# Altium schematic symbol library AD_Lib.SchLib: 1239 symbols (part 7 of 9)
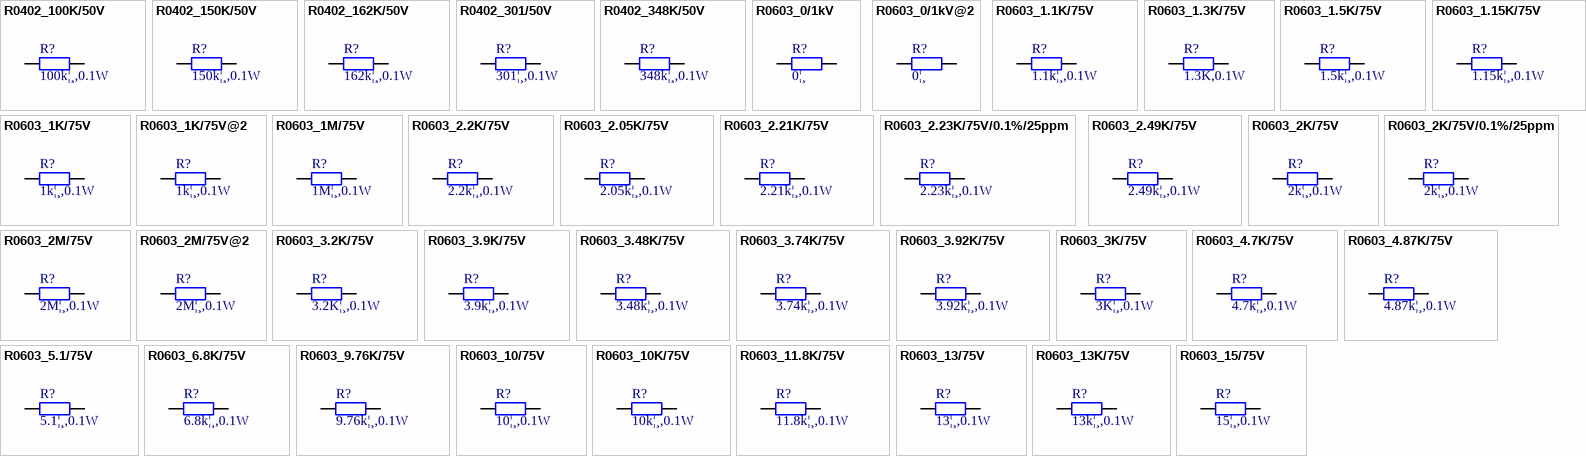
[diagram p48: symbols R0402_100K/50V to R0603_15/75V]

## R0603_3.74K/75V
designator R?, comment 3.74k¦¸,0.1W
ÌùÆ¬µç×è; Manufacturer: KOA; pro-environment: RoHS; Quality: -55~155¡æ; SN: 03.4.38.11.16037501S; other: 3.74k¦¸,0.1W,1%,75V; OPN: RK73H1JTTD3741F; PadsNum: 2; Category: µç×è; Part: RK73H1JTTD3741F; Value: 3.74k¦¸,0.1W; QTY: 5000; Price: 0.0234; OPN_JLC: OPN_JLC; SN_JLC: SN_JLC; Price_JLC: 0
footprint R0603 (ÌùÆ¬µç×è£¬¹¦ÂÊ1/10W)
pins: 1, 2

## R0603_3.92K/75V
designator R?, comment 3.92k¦¸,0.1W
ÌùÆ¬µç×è; Manufacturer: Yageo; pro-environment: RoHS; Quality: -55~155¡æ; other: 3.92k¦¸,0.1W,1%,75V; OPN: RC0603FR-07392KL; PadsNum: 2; SN: SN; Category: µç×è; Part: RC0603FR-07392KL; Value: 3.92k¦¸,0.1W; QTY: 5000; Price: 0.004947; OPN_JLC: RC0603FR-07392KL; SN_JLC: C245963; Price_JLC: 0.004947
footprint R0603 (ÌùÆ¬µç×è£¬¹¦ÂÊ1/10W)
pins: 1, 2

## R0603_3K/75V
designator R?, comment 3K¦¸,0.1W
ÌùÆ¬µç×è; Manufacturer: KOA; pro-environment: RoHS; Quality: -55~155¡æ; SN: 03.4.38.27.16300101S; other: 3K¦¸,0.1W,1%,75V; OPN: RN73H1JTTD3001B25; PadsNum: 2; Category: µç×è; Part: RN73H1JTTD3001B25; Value: 3K¦¸,0.1W; QTY: 5000; Price: 0.7605; OPN_JLC: 0603WAF3001T5E; SN_JLC: C4211; Price_JLC: 0
footprint R0603 (ÌùÆ¬µç×è£¬¹¦ÂÊ1/10W)
pins: 1, 2

## R0603_4.7K/75V
designator R?, comment 4.7k¦¸,0.1W
ÌùÆ¬µç×è; Manufacturer: KOA; pro-environment: RoHS; Quality: -55~155¡æ; other: 4.7k¦¸,0.1W,1%,75V; OPN: RK73H1JTTD4701F; PadsNum: 2; SN: SN; Category: µç×è; Part: RK73H1JTTD4701F; Value: 4.7k¦¸,0.1W; QTY: 5000; Price: 0.01582; OPN_JLC: RC0603JR-074K7L; SN_JLC: C105428; Price_JLC: 0.005073
footprint R0603 (ÌùÆ¬µç×è£¬¹¦ÂÊ1/10W)
pins: 1, 2

## R0603_4.87K/75V
designator R?, comment 4.87k¦¸,0.1W
ÌùÆ¬µç×è; Manufacturer: KOA; pro-environment: RoHS; Quality: -55~155¡æ; SN: 03.4.38.11.16049201S; other: 4.87k¦¸,0.1W,1%,75V; OPN: RK73H1JTTD4871F; PadsNum: 2; Category: µç×è; Part: RK73H1JTTD4871F; Value: 4.87k¦¸,0.1W; QTY: 5000; Price: 0.02457; OPN_JLC: OPN_JLC; SN_JLC: SN_JLC; Price_JLC: 0
footprint R0603 (ÌùÆ¬µç×è£¬¹¦ÂÊ1/10W)
pins: 1, 2

## R0603_5.1/75V
designator R?, comment 5.1¦¸,0.1W
ÌùÆ¬µç×è; Manufacturer: KOA; pro-environment: RoHS; Quality: -55~155¡æ; other: 5.1¦¸,0.1W,1%,75V; OPN: RK73H1JTTD5R10F; PadsNum: 2; SN: SN; Category: µç×è; Part: RK73H1JTTD5R10F; Value: 5.1¦¸,0.1W; QTY: 5000; Price: 0.0234; OPN_JLC: 0603WAF510KT5E; SN_JLC: C25197; Price_JLC: 0
footprint R0603 (ÌùÆ¬µç×è£¬¹¦ÂÊ1/10W)
pins: 1, 2

## R0603_6.8K/75V
designator R?, comment 6.8k¦¸,0.1W
ÌùÆ¬µç×è; Manufacturer: KOA; pro-environment: RoHS; Quality: -55~155¡æ; other: 6.8k¦¸,0.1W,1%,75V; OPN: RK73H1JRTTD6801F; PadsNum: 2; SN: SN; Category: µç×è; Part: RK73H1JRTTD6801F; Value: 6.8k¦¸,0.1W; Price: ?; OPN_JLC: 0603WAF6801T5E; SN_JLC: C23212; Price_JLC: 0
footprint R0603 (ÌùÆ¬µç×è£¬¹¦ÂÊ1/10W)
pins: 1, 2

## R0603_9.76K/75V
designator R?, comment 9.76k¦¸,0.1W
ÌùÆ¬µç×è; Manufacturer: KOA; pro-environment: RoHS; Quality: -55~155¡æ; SN: 03.4.38.27.16976101S; other: 9.76k¦¸,0.1W,1%,75V; OPN: RN73H1JTTD9761B25; PadsNum: 2; Category: µç×è; Part: RN73H1JTTD9761B25; Value: 9.76k¦¸,0.1W; QTY: 5000; Price: 0.7605; OPN_JLC: OPN_JLC; SN_JLC: SN_JLC; Price_JLC: 0
footprint R0603 (ÌùÆ¬µç×è£¬¹¦ÂÊ1/10W)
pins: 1, 2

## R0603_10/75V
designator R?, comment 10¦¸,0.1W
ÌùÆ¬µç×è; Manufacturer: KOA; pro-environment: RoHS; Quality: -55~155¡æ; other: 10¦¸,0.1W,1%,75V; OPN: RK73H1JTTD10R0F; PadsNum: 2; SN: SN; Category: µç×è; Part: RK73H1JTTD10R0F; Value: 10¦¸,0.1W; QTY: 5000; Price: 0.0234; OPN_JLC: 0603WAF100JT5E; SN_JLC: C22859; Price_JLC: 0
footprint R0603 (ÌùÆ¬µç×è£¬¹¦ÂÊ1/10W)
pins: 1, 2

## R0603_10K/75V
designator R?, comment 10k¦¸,0.1W
ÌùÆ¬µç×è; Manufacturer: KOA; pro-environment: RoHS; Quality: -55~155¡æ; other: 10k¦¸,0.1W,1%,75V; OPN: RK73H1JTTD1002F; PadsNum: 2; SN: SN; Category: µç×è; Part: RK73H1JTTD1002F; Value: 10k¦¸,0.1W; QTY: 5000; Price: ?; OPN_JLC: RC0603FR-0710KL; SN_JLC: C98220; Price_JLC: 0.004792
footprint R0603 (ÌùÆ¬µç×è£¬¹¦ÂÊ1/10W)
pins: 1, 2

## R0603_11.8K/75V
designator R?, comment 11.8k¦¸,0.1W
ÌùÆ¬µç×è; Manufacturer: KOA; pro-environment: RoHS; Quality: -55~155¡æ; other: 11.8k¦¸,0.1W,1%,75V; OPN: RK73H1JTTD1182F; PadsNum: 2; SN: SN; Category: µç×è; Part: RK73H1JTTD1182F; Value: 11.8k¦¸,0.1W; QTY: 5000; Price: ?; OPN_JLC: OPN_JLC; SN_JLC: SN_JLC; Price_JLC: 0
footprint R0603 (ÌùÆ¬µç×è£¬¹¦ÂÊ1/10W)
pins: 1, 2

## R0603_13/75V
designator R?, comment 13¦¸,0.1W
ÌùÆ¬µç×è; Manufacturer: Yageo; pro-environment: RoHS; Quality: -55~155¡æ; other: 13¦¸,0.1W,1%,75V; OPN: RC0603FR-0713KL; PadsNum: 2; SN: SN; Category: µç×è; Part: RC0603FR-0713KL; Value: 13¦¸,0.1W; QTY: 5000; Price: 0.006236; OPN_JLC: RC0603FR-0713KL; SN_JLC: C137796; Price_JLC: 0.006236
footprint R0603 (ÌùÆ¬µç×è£¬¹¦ÂÊ1/10W)
pins: 1, 2

## R0603_13K/75V
designator R?, comment 13k¦¸,0.1W
ÌùÆ¬µç×è; Manufacturer: KOA; pro-environment: RoHS; Quality: -55~155¡æ; SN: 03.4.38.11.16013301S; other: 13k¦¸,0.1W,1%,75V; OPN: RK73H1JTTD1302F; PadsNum: 2; Category: µç×è; Part: RK73H1JTTD1302F; Value: 13k¦¸,0.1W; Price: ?; OPN_JLC: 0603WAF1302T5E; SN_JLC: C22797; Price_JLC: 0
footprint R0603 (ÌùÆ¬µç×è£¬¹¦ÂÊ1/10W)
pins: 1, 2

## R0603_15/75V
designator R?, comment 15¦¸,0.1W
ÌùÆ¬µç×è; Manufacturer: KOA; pro-environment: RoHS; Quality: -55~155¡æ; other: 15¦¸,0.1W,1%,75V; OPN: RK73H1JTTD15R0F; PadsNum: 2; SN: SN; Category: µç×è; Part: RK73H1JTTD15R0F; Value: 15¦¸,0.1W; QTY: 5000; Price: 0.0234; OPN_JLC: 0603WAF150JT5E; SN_JLC: C22810; Price_JLC: 0
footprint R0603 (ÌùÆ¬µç×è£¬¹¦ÂÊ1/10W)
pins: 1, 2

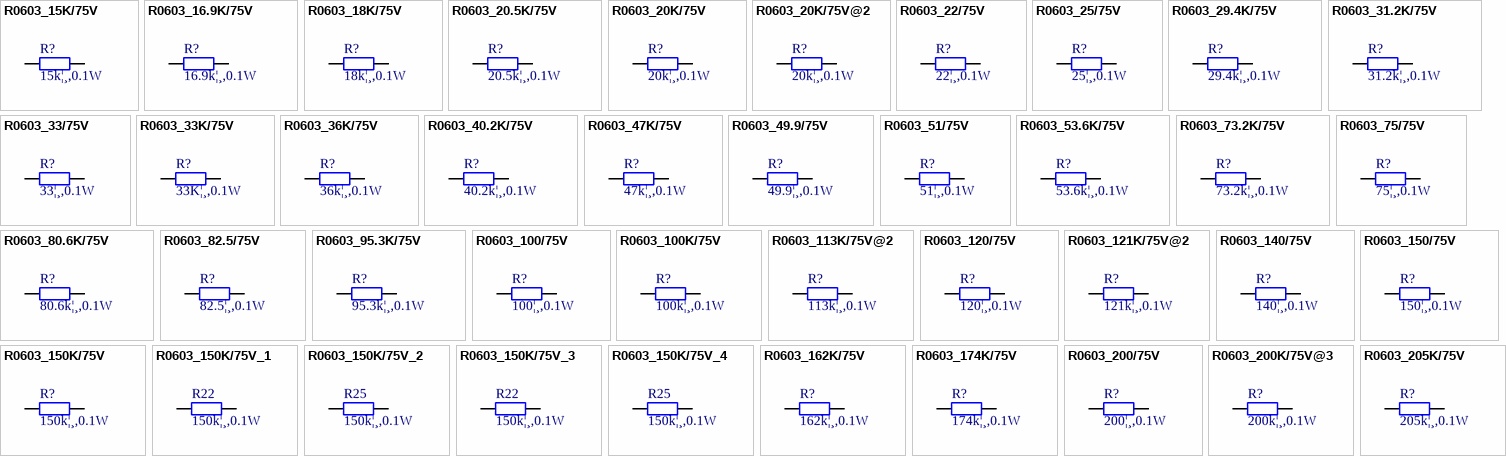
[diagram p30: symbols R0603_15K/75V to R0603_205K/75V]

## R0603_15K/75V
designator R?, comment 15k¦¸,0.1W
ÌùÆ¬µç×è; Manufacturer: Yageo; pro-environment: RoHS; Quality: -55~155¡æ; other: 15k¦¸,0.1W,1%,75V; OPN: RC0603FR-0715KL; PadsNum: 2; SN: SN; Category: µç×è; Part: RC0603FR-0715KL; Value: 15k¦¸,0.1W; QTY: 5000; Price: ?; OPN_JLC: RC0603FR-0715KL; SN_JLC: C114661; Price_JLC: 0.008262
footprint R0603 (ÌùÆ¬µç×è£¬¹¦ÂÊ1/10W)
pins: 1, 2

## R0603_16.9K/75V
designator R?, comment 16.9k¦¸,0.1W
ÌùÆ¬µç×è; Manufacturer: KOA; pro-environment: RoHS; Quality: -55~155¡æ; other: 16.9k¦¸,0.1W,1%,75V; OPN: RK73H1JTTD1692F; PadsNum: 2; SN: SN; Category: µç×è; Part: RK73H1JTTD1692F; Value: 16.9k¦¸,0.1W; QTY: 5000; Price: 0.02457; OPN_JLC: OPN_JLC; SN_JLC: SN_JLC; Price_JLC: 0
footprint R0603 (ÌùÆ¬µç×è£¬¹¦ÂÊ1/10W)
pins: 1, 2

## R0603_18K/75V
designator R?, comment 18k¦¸,0.1W
ÌùÆ¬µç×è; Manufacturer: KOA; pro-environment: RoHS; Quality: -55~155¡æ; SN: 03.4.38.11.16018301S; other: 18k¦¸,0.1W,1%,75V; OPN: RK73H1JTTD1802F; PadsNum: 2; Category: µç×è; Part: RK73H1JTTD1802F; Value: 18k¦¸,0.1W; QTY: 5000; Price: 0.02457; OPN_JLC: 0603WAF1802T5E; SN_JLC: C25810; Price_JLC: 0
footprint R0603 (ÌùÆ¬µç×è£¬¹¦ÂÊ1/10W)
pins: 1, 2

## R0603_20.5K/75V
designator R?, comment 20.5k¦¸,0.1W
ÌùÆ¬µç×è; Manufacturer: KOA; pro-environment: RoHS; Quality: -55~155¡æ; SN: 03.4.38.27.16205201S; other: 20.5k¦¸,0.1W,1%,75V; OPN: RN73H1JTTD2052B25; PadsNum: 2; Category: µç×è; Part: RN73H1JTTD2052B25; Value: 20.5k¦¸,0.1W; QTY: 5000; Price: 0.7605; OPN_JLC: OPN_JLC; SN_JLC: SN_JLC; Price_JLC: 0
footprint R0603 (ÌùÆ¬µç×è£¬¹¦ÂÊ1/10W)
pins: 1, 2

## R0603_20K/75V
designator R?, comment 20k¦¸,0.1W
ÌùÆ¬µç×è; Manufacturer: KOA; pro-environment: RoHS; Quality: -55~155¡æ; SN: 03.4.38.11.16020302S; other: 20k¦¸,0.1W,1%,75V; OPN: RK73H1JTTD2002F; PadsNum: 2; Category: µç×è; Part: RK73H1JTTD2002F; Value: 20k¦¸,0.1W; QTY: 5000; Price: ?; OPN_JLC: 0603WAF2002T5E; SN_JLC: C4184; Price_JLC: 0
footprint R0603 (ÌùÆ¬µç×è£¬¹¦ÂÊ1/10W)
pins: 1, 2

## R0603_20K/75V@2
designator R?, comment 20k¦¸,0.1W
ÌùÆ¬µç×è; Manufacturer: Panasonic; pro-environment: RoHS; Quality: -55~155¡æ; other: 20k¦¸,0.1W,1%,75V; OPN: ERJ-3EKF2002V; PadsNum: 2; SN: SN; Category: µç×è; Part: ERJ-3EKF2002V; Value: 20k¦¸,0.1W; Price: ?; OPN_JLC: 0603WAF2002T5E; SN_JLC: C4184; Price_JLC: 0
footprint R0603 (ÌùÆ¬µç×è£¬¹¦ÂÊ1/10W)
pins: 1, 2

## R0603_22/75V
designator R?, comment 22¦¸,0.1W
ÌùÆ¬µç×è; Manufacturer: KOA; pro-environment: RoHS; Quality: -55~155¡æ; SN: 03.4.38.11.16022002S; other: 22¦¸,0.1W,1%,75V; OPN: RK73H1JTTD22R0F; PadsNum: 2; Category: µç×è; Part: RK73H1JTTD22R0F; Value: 22¦¸,0.1W; QTY: 5000; Price: ?; OPN_JLC: 0603WAF220JT5E; SN_JLC: C23345; Price_JLC: 0
footprint R0603 (ÌùÆ¬µç×è£¬¹¦ÂÊ1/10W)
pins: 1, 2

## R0603_25/75V
designator R?, comment 25¦¸,0.1W
ÌùÆ¬µç×è; Manufacturer: KOA; pro-environment: RoHS; Quality: -55~155¡æ; other: 25¦¸,0.1W,1%,75V; OPN: RK73H1JTTD24R9F; PadsNum: 2; SN: SN; Category: µç×è; Part: RK73H1JTTD24R9F; Value: 25¦¸,0.1W; QTY: 5000; Price: 0.0234; OPN_JLC: OPN_JLC; SN_JLC: SN_JLC; Price_JLC: 0
footprint R0603 (ÌùÆ¬µç×è£¬¹¦ÂÊ1/10W)
pins: 1, 2

## R0603_29.4K/75V
designator R?, comment 29.4k¦¸,0.1W
ÌùÆ¬µç×è; Manufacturer: KOA; pro-environment: RoHS; Quality: -55~155¡æ; other: 29.4k¦¸,0.1W,1%,75V; OPN: RK73H1JTTD2942F; PadsNum: 2; SN: SN; Category: µç×è; Part: RK73H1JTTD2942F; Value: 29.4k¦¸,0.1W; QTY: 5000; Price: ?; OPN_JLC: OPN_JLC; SN_JLC: SN_JLC; Price_JLC: 0
footprint R0603 (ÌùÆ¬µç×è£¬¹¦ÂÊ1/10W)
pins: 1, 2

## R0603_31.2K/75V
designator R?, comment 31.2k¦¸,0.1W
ÌùÆ¬µç×è; Manufacturer: KOA; pro-environment: RoHS; Quality: -55~155¡æ; other: 31.2k¦¸,0.1W,1%,75V; OPN: RK73H1JTTD3162F; PadsNum: 2; SN: SN; Category: µç×è; Part: RK73H1JTTD3162F; Value: 31.2k¦¸,0.1W; QTY: 5000; Price: ?; OPN_JLC: OPN_JLC; SN_JLC: SN_JLC; Price_JLC: 0
footprint R0603 (ÌùÆ¬µç×è£¬¹¦ÂÊ1/10W)
pins: 1, 2

## R0603_33/75V
designator R?, comment 33¦¸,0.1W
ÌùÆ¬µç×è; Manufacturer: KOA; pro-environment: RoHS; Quality: -55~155¡æ; SN: 03.4.38.11.16033001S; other: 33¦¸,0.1W,1%,75V; OPN: RK73H1JTTD33R0F; PadsNum: 2; Category: µç×è; Part: RK73H1JTTD33R0F; Value: 33¦¸,0.1W; QTY: 5000; Price: ?; OPN_JLC: 0603WAF330JT5E; SN_JLC: C23140; Price_JLC: 0
footprint R0603 (ÌùÆ¬µç×è£¬¹¦ÂÊ1/10W)
pins: 1, 2

## R0603_33K/75V
designator R?, comment 33K¦¸,0.1W
ÌùÆ¬µç×è; Manufacturer: Yageo; pro-environment: RoHS; Quality: -55~155¡æ; SN: 03.4.38.11.16033301S; other: 33K¦¸,0.1W,1%,75V; OPN: RC0603FR-0733KL; PadsNum: 2; Category: µç×è; Part: RC0603FR-0733KL; Value: 33K¦¸,0.1W; QTY: 5000; Price: 0.00819; OPN_JLC: 0603WAF3302T5E; SN_JLC: C4216; Price_JLC: 0
footprint R0603 (ÌùÆ¬µç×è£¬¹¦ÂÊ1/10W)
pins: 1, 2

## R0603_36K/75V
designator R?, comment 36k¦¸,0.1W
ÌùÆ¬µç×è; Manufacturer: KOA; pro-environment: RoHS; Quality: -55~155¡æ; other: 36k¦¸,0.1W,1%,75V; OPN: RK73H1JTTD3602F; PadsNum: 2; SN: SN; Category: µç×è; Part: RK73H1JTTD3602F; Value: 36k¦¸,0.1W; QTY: 5000; Price: ?; OPN_JLC: 0603WAF3602T5E; SN_JLC: C23147; Price_JLC: 0
footprint R0603 (ÌùÆ¬µç×è£¬¹¦ÂÊ1/10W)
pins: 1, 2

## R0603_40.2K/75V
designator R?, comment 40.2k¦¸,0.1W
ÌùÆ¬µç×è; Manufacturer: KOA; pro-environment: RoHS; Quality: -55~155¡æ; SN: 03.4.38.11.16040401S; other: 40.2k¦¸,0.1W,1%,75V; OPN: RK73H1JTTD4022F; PadsNum: 2; Category: µç×è; Part: RK73H1JTTD4022F; Value: 40.2k¦¸,0.1W; Price: ?; OPN_JLC: 0603WAF4022T5E; SN_JLC: C12447; Price_JLC: 0
footprint R0603 (ÌùÆ¬µç×è£¬¹¦ÂÊ1/10W)
pins: 1, 2

## R0603_47K/75V
designator R?, comment 47k¦¸,0.1W
ÌùÆ¬µç×è; Manufacturer: KOA; pro-environment: RoHS; Quality: -55~155¡æ; other: 47k¦¸,0.1W,1%,75V; OPN: RK73H1JTTD4702F; PadsNum: 2; SN: SN; Category: µç×è; Part: RK73H1JTTD4702F; Value: 47k¦¸,0.1W; QTY: 5000; Price: ?; OPN_JLC: RC0603FR-0747KL; SN_JLC: C105579; Price_JLC: 0.006135
footprint R0603 (ÌùÆ¬µç×è£¬¹¦ÂÊ1/10W)
pins: 1, 2

## R0603_49.9/75V
designator R?, comment 49.9¦¸,0.1W
ÌùÆ¬µç×è; Manufacturer: KOA; pro-environment: RoHS; Quality: -55~155¡æ; SN: 03.4.38.11.16050003S; other: 49.9¦¸,0.1W,1%,75V; OPN: RK73H1JTTD49R9F; PadsNum: 2; Category: µç×è; Part: RK73H1JTTD49R9F; Value: 49.9¦¸,0.1W; QTY: 5000; Price: ?; OPN_JLC: 0603WAF499JT5E; SN_JLC: C23185; Price_JLC: 0
footprint R0603 (ÌùÆ¬µç×è£¬¹¦ÂÊ1/10W)
pins: 1, 2

## R0603_51/75V
designator R?, comment 51¦¸,0.1W
ÌùÆ¬µç×è; Manufacturer: KOA; pro-environment: RoHS; Quality: -55~155¡æ; other: 51¦¸,0.1W,1%,75V; OPN: RK73H1JTTD51R0F; PadsNum: 2; SN: SN; Category: µç×è; Part: RK73H1JTTD51R0F; Value: 51¦¸,0.1W; QTY: 5000; Price: 0.0234; OPN_JLC: 0603WAF510JT5E; SN_JLC: C23197; Price_JLC: 0
footprint R0603 (ÌùÆ¬µç×è£¬¹¦ÂÊ1/10W)
pins: 1, 2

## R0603_53.6K/75V
designator R?, comment 53.6k¦¸,0.1W
ÌùÆ¬µç×è; Manufacturer: KOA; pro-environment: RoHS; Quality: -55~155¡æ; SN: 03.4.38.11.16054301S; other: 53.6k¦¸,0.1W,1%,75V; OPN: RK73H1JTTD5362F; PadsNum: 2; Category: µç×è; Part: RK73H1JTTD5362F; Value: 53.6k¦¸,0.1W; QTY: 5000; Price: ?; OPN_JLC: OPN_JLC; SN_JLC: SN_JLC; Price_JLC: 0
footprint R0603 (ÌùÆ¬µç×è£¬¹¦ÂÊ1/10W)
pins: 1, 2

## R0603_73.2K/75V
designator R?, comment 73.2k¦¸,0.1W
ÌùÆ¬µç×è; Manufacturer: KOA; pro-environment: RoHS; Quality: -55~155¡æ; SN: 03.4.38.11.16073301S; other: 73.2k¦¸,0.1W,1%,75V; OPN: RK73H1JTTD7322F; PadsNum: 2; Category: µç×è; Part: RK73H1JTTD7322F; Value: 73.2k¦¸,0.1W; QTY: 5000; Price: 0.02457; OPN_JLC: OPN_JLC; SN_JLC: SN_JLC; Price_JLC: 0
footprint R0603 (ÌùÆ¬µç×è£¬¹¦ÂÊ1/10W)
pins: 1, 2

## R0603_75/75V
designator R?, comment 75¦¸,0.1W
ÌùÆ¬µç×è; Manufacturer: KOA; pro-environment: RoHS; Quality: -55~155¡æ; SN: 03.4.38.11.16075001S; other: 75¦¸,0.1W,1%,75V; OPN: RK73H1JTTD75R0F; PadsNum: 2; Category: µç×è; Part: RK73H1JTTD75R0F; Value: 75¦¸,0.1W; Price: ?; OPN_JLC: 0603WAF750JT5E; SN_JLC: C4275; Price_JLC: 0
footprint R0603 (ÌùÆ¬µç×è£¬¹¦ÂÊ1/10W)
pins: 1, 2

## R0603_80.6K/75V
designator R?, comment 80.6k¦¸,0.1W
ÌùÆ¬µç×è; Manufacturer: KOA; pro-environment: RoHS; Quality: -55~155¡æ; other: 80k¦¸,0.1W,1%,75V; OPN: RK73H1JTTD8062F; PadsNum: 2; SN: SN; Category: µç×è; Part: RK73H1JTTD8062F; Value: 80.6k¦¸,0.1W; QTY: 5000; Price: ?; OPN_JLC: OPN_JLC; SN_JLC: SN_JLC; Price_JLC: 0
footprint R0603 (ÌùÆ¬µç×è£¬¹¦ÂÊ1/10W)
pins: 1, 2

## R0603_82.5/75V
designator R?, comment 82.5¦¸,0.1W
ÌùÆ¬µç×è; Manufacturer: KOA; pro-environment: RoHS; Quality: -55~155¡æ; other: 82.5¦¸,0.1W,1%,75V; OPN: RK73H1JTTD82R5F; PadsNum: 2; SN: SN; Category: µç×è; Part: RK73H1JTTD82R5F; Value: 82.5¦¸,0.1W; QTY: 5000; Price: 0.0234; OPN_JLC: OPN_JLC; SN_JLC: SN_JLC; Price_JLC: 0
footprint R0603 (ÌùÆ¬µç×è£¬¹¦ÂÊ1/10W)
pins: 1, 2

## R0603_95.3K/75V
designator R?, comment 95.3k¦¸,0.1W
ÌùÆ¬µç×è; Manufacturer: Yageo; pro-environment: RoHS; Quality: -55~155¡æ; other: 95.3k¦¸,0.1W,1%,75V; OPN: RC0603FR-0795K3L; PadsNum: 2; SN: SN; Category: µç×è; Part: RC0603FR-0795K3L; Value: 95.3k¦¸,0.1W; QTY: 5000; Price: 0.7605; OPN_JLC: RC0603FR-0795K3L; SN_JLC: C137667; Price_JLC: 0.008223
footprint R0603 (ÌùÆ¬µç×è£¬¹¦ÂÊ1/10W)
pins: 1, 2

## R0603_100/75V
designator R?, comment 100¦¸,0.1W
ÌùÆ¬µç×è; Manufacturer: KOA; pro-environment: RoHS; Quality: -55~155¡æ; SN: 03.4.38.11.16010101S; other: 100¦¸,0.1W,1%,75V; OPN: RK73H1JTTD1000F; PadsNum: 2; Category: µç×è; Part: RK73H1JTTD1000F; Value: 100¦¸,0.1W; QTY: 5000; Price: 0.0234; OPN_JLC: 0603WAF1000T5E; SN_JLC: C22775; Price_JLC: 0
footprint R0603 (ÌùÆ¬µç×è£¬¹¦ÂÊ1/10W)
pins: 1, 2

## R0603_100K/75V
designator R?, comment 100k¦¸,0.1W
ÌùÆ¬µç×è; Manufacturer: KOA; pro-environment: RoHS; Quality: -55~155¡æ; SN: 03.4.38.11.16010502S; other: 100k¦¸,0.1W,1%,75V; OPN: RK73H1JTTD1003F; PadsNum: 2; Category: µç×è; Part: RK73H1JTTD1003F; Value: 100k¦¸,0.1W; Price: ?; OPN_JLC: 0603WAF1003T5E; SN_JLC: C25803; Price_JLC: 0
footprint R0603 (ÌùÆ¬µç×è£¬¹¦ÂÊ1/10W)
pins: 1, 2

## R0603_113K/75V@2
designator R?, comment 113k¦¸,0.1W
ÌùÆ¬µç×è; Manufacturer: Panasonic; pro-environment: RoHS; Quality: -55~155¡æ; SN: 03.4.38.11.16011401S; other: 13k¦¸,0.1W,1%,75V; OPN: ERJ-3EKF1133V; PadsNum: 2; Category: µç×è; Part: ERJ-3EKF1133V; Value: 113k¦¸,0.1W; QTY: 5000; Price: 0.01521; OPN_JLC: OPN_JLC; SN_JLC: SN_JLC; Price_JLC: 0
footprint R0603 (ÌùÆ¬µç×è£¬¹¦ÂÊ1/10W)
pins: 1, 2

## R0603_120/75V
designator R?, comment 120¦¸,0.1W
ÌùÆ¬µç×è; Manufacturer: KOA; pro-environment: RoHS; Quality: -55~155¡æ; other: 120¦¸,0.1W,1%,75V; OPN: RK73H1JTTD1200F; PadsNum: 2; SN: SN; Category: µç×è; Part: RK73H1JTTD1200F; Value: 120¦¸,0.1W; QTY: 5000; Price: 0.0234; OPN_JLC: 0603WAF1200T5E; SN_JLC: C22787; Price_JLC: 0
footprint R0603 (ÌùÆ¬µç×è£¬¹¦ÂÊ1/10W)
pins: 1, 2

## R0603_121K/75V@2
designator R?, comment 121k¦¸,0.1W
ÌùÆ¬µç×è; Manufacturer: KOA; pro-environment: RoHS; Quality: -55~155¡æ; SN: 03.4.38.11.16012401S; other: 121k¦¸,0.1W,1%,75V; OPN: ERJ-3EKF1213V; PadsNum: 2; Category: µç×è; Part: ERJ-3EKF1213V; Value: 121k¦¸,0.1W; QTY: 5000; Price: 0.01638; OPN_JLC: OPN_JLC; SN_JLC: SN_JLC; Price_JLC: 0
footprint R0603 (ÌùÆ¬µç×è£¬¹¦ÂÊ1/10W)
pins: 1, 2

## R0603_140/75V
designator R?, comment 140¦¸,0.1W
ÌùÆ¬µç×è; Manufacturer: KOA; pro-environment: RoHS; Quality: -55~155¡æ; other: 140¦¸,0.1W,1%,75V; OPN: RK73H1JTTD1400F; PadsNum: 2; SN: SN; Category: µç×è; Part: RK73H1JTTD1400F; Value: 140¦¸,0.1W; QTY: 5000; Price: 0.0234; OPN_JLC: OPN_JLC; SN_JLC: SN_JLC; Price_JLC: 0
footprint R0603 (ÌùÆ¬µç×è£¬¹¦ÂÊ1/10W)
pins: 1, 2

## R0603_150/75V
designator R?, comment 150¦¸,0.1W
ÌùÆ¬µç×è; Manufacturer: KOA; pro-environment: RoHS; Quality: -55~155¡æ; other: 150¦¸,0.1W,1%,75V; OPN: RK73H1JTTD1500F; PadsNum: 2; SN: SN; Category: µç×è; Part: RK73H1JTTD1500F; Value: 150¦¸,0.1W; QTY: 5000; Price: 0.0234; OPN_JLC: 0603WAF1500T5E; SN_JLC: C22808; Price_JLC: 0
footprint R0603 (ÌùÆ¬µç×è£¬¹¦ÂÊ1/10W)
pins: 1, 2

## R0603_150K/75V
designator R?, comment 150k¦¸,0.1W
ÌùÆ¬µç×è; Manufacturer: Panasonic; pro-environment: RoHS; Quality: -55~155¡æ; other: 150K¦¸,0.1W,1%,75V; OPN: ERJ-3EKF1503V; PadsNum: 2; SN: SN; Category: µç×è; Part: ERJ-3EKF1503V; Value: 150k¦¸,0.1W; QTY: 5000; Price: 0.01521; OPN_JLC: RC0603FR-07150KL; SN_JLC: C114660; Price_JLC: 0.006231
footprint R0603 (ÌùÆ¬µç×è£¬¹¦ÂÊ1/10W)
pins: 1, 2

## R0603_150K/75V_1
designator R22, comment 150k¦¸,0.1W
ÌùÆ¬µç×è; Manufacturer: Panasonic; pro-environment: RoHS; Quality: -55~155¡æ; other: 150K¦¸,0.1W,1%,75V; OPN: ERJ-3EKF1503V; PadsNum: 2; SN: SN; Category: µç×è; Part: ERJ-3EKF1503V; Value: 150k¦¸,0.1W; QTY: 5000; Price: 0.01521; OPN_JLC: RC0603FR-07150KL; SN_JLC: C114660; Price_JLC: 0.006231
footprint R0603 (ÌùÆ¬µç×è£¬¹¦ÂÊ1/10W)
pins: 1, 2

## R0603_150K/75V_2
designator R25, comment 150k¦¸,0.1W
ÌùÆ¬µç×è; Manufacturer: Panasonic; pro-environment: RoHS; Quality: -55~155¡æ; other: 150K¦¸,0.1W,1%,75V; OPN: ERJ-3EKF1503V; PadsNum: 2; SN: SN; Category: µç×è; Part: ERJ-3EKF1503V; Value: 150k¦¸,0.1W; QTY: 5000; Price: 0.01521; OPN_JLC: RC0603FR-07150KL; SN_JLC: C114660; Price_JLC: 0.006231
footprint R0603 (ÌùÆ¬µç×è£¬¹¦ÂÊ1/10W)
pins: 1, 2

## R0603_150K/75V_3
designator R22, comment 150k¦¸,0.1W
ÌùÆ¬µç×è; Manufacturer: Panasonic; pro-environment: RoHS; Quality: -55~155¡æ; other: 150K¦¸,0.1W,1%,75V; OPN: ERJ-3EKF1503V; PadsNum: 2; SN: SN; Category: µç×è; Part: ERJ-3EKF1503V; Value: 150k¦¸,0.1W; QTY: 5000; Price: 0.01521; OPN_JLC: RC0603FR-07150KL; SN_JLC: C114660; Price_JLC: 0.006231
footprint R0603 (ÌùÆ¬µç×è£¬¹¦ÂÊ1/10W)
pins: 1, 2

## R0603_150K/75V_4
designator R25, comment 150k¦¸,0.1W
ÌùÆ¬µç×è; Manufacturer: Panasonic; pro-environment: RoHS; Quality: -55~155¡æ; other: 150K¦¸,0.1W,1%,75V; OPN: ERJ-3EKF1503V; PadsNum: 2; SN: SN; Category: µç×è; Part: ERJ-3EKF1503V; Value: 150k¦¸,0.1W; QTY: 5000; Price: 0.01521; OPN_JLC: RC0603FR-07150KL; SN_JLC: C114660; Price_JLC: 0.006231
footprint R0603 (ÌùÆ¬µç×è£¬¹¦ÂÊ1/10W)
pins: 1, 2

## R0603_162K/75V
designator R?, comment 162k¦¸,0.1W
ÌùÆ¬µç×è; Manufacturer: KOA; pro-environment: RoHS; Quality: -55~155¡æ; other: 162k¦¸,0.1W,1%,75V; OPN: RC0603FR-07162KL; PadsNum: 2; SN: SN; Category: µç×è; Part: RC0603FR-07162KL; Value: 162k¦¸,0.1W; QTY: 5000; Price: ?; OPN_JLC: RC0603FR-07162KL; SN_JLC: C165760; Price_JLC: 0.0061
footprint R0603 (ÌùÆ¬µç×è£¬¹¦ÂÊ1/10W)
pins: 1, 2

## R0603_174K/75V
designator R?, comment 174k¦¸,0.1W
ÌùÆ¬µç×è; Manufacturer: KOA; pro-environment: RoHS; Quality: -55~155¡æ; other: 174k¦¸,0.1W,1%,75V; OPN: RK73H1JTTD1743F; PadsNum: 2; SN: SN; Category: µç×è; Part: RK73H1JTTD1743F; Value: 174k¦¸,0.1W; QTY: 5000; Price: 0.0234; OPN_JLC: OPN_JLC; SN_JLC: SN_JLC; Price_JLC: 0
footprint R0603 (ÌùÆ¬µç×è£¬¹¦ÂÊ1/10W)
pins: 1, 2

## R0603_200/75V
designator R?, comment 200¦¸,0.1W
ÌùÆ¬µç×è; Manufacturer: KOA; pro-environment: RoHS; Quality: -55~155¡æ; other: 200¦¸,0.1W,1%,75V; OPN: RK73H1JTTD2000F; PadsNum: 2; SN: SN; Category: µç×è; Part: RK73H1JTTD2000F; Value: 200¦¸,0.1W; QTY: 5000; Price: 0.0234; OPN_JLC: 0603WAF2000T5E; SN_JLC: C8218; Price_JLC: 0
footprint R0603 (ÌùÆ¬µç×è£¬¹¦ÂÊ1/10W)
pins: 1, 2

## R0603_200K/75V@3
designator R?, comment 200k¦¸,0.1W
ÌùÆ¬µç×è; Manufacturer: Yageo; pro-environment: RoHS; Quality: -55~155¡æ; SN: 03.4.38.11.16020401S; other: 200k¦¸,0.1W,1%,75V; OPN: RC0603FR-07200KL; PadsNum: 2; Category: µç×è; Part: RC0603FR-07200KL; Value: 200k¦¸,0.1W; QTY: 5000; Price: ?; OPN_JLC: 0603WAF2003T5E; SN_JLC: C25811; Price_JLC: 0
footprint R0603 (ÌùÆ¬µç×è£¬¹¦ÂÊ1/10W)
pins: 1, 2

## R0603_205K/75V
designator R?, comment 205k¦¸,0.1W
ÌùÆ¬µç×è; Manufacturer: KOA; pro-environment: RoHS; Quality: -55~155¡æ; SN: 03.4.38.27.16205301S; other: 205k¦¸,0.1W,1%,75V; OPN: RN73H1JTTD2053B25; PadsNum: 2; Category: µç×è; Part: RN73H1JTTD2053B25; Value: 205k¦¸,0.1W; QTY: 5000; Price: 0.7605; OPN_JLC: OPN_JLC; SN_JLC: SN_JLC; Price_JLC: 0
footprint R0603 (ÌùÆ¬µç×è£¬¹¦ÂÊ1/10W)
pins: 1, 2

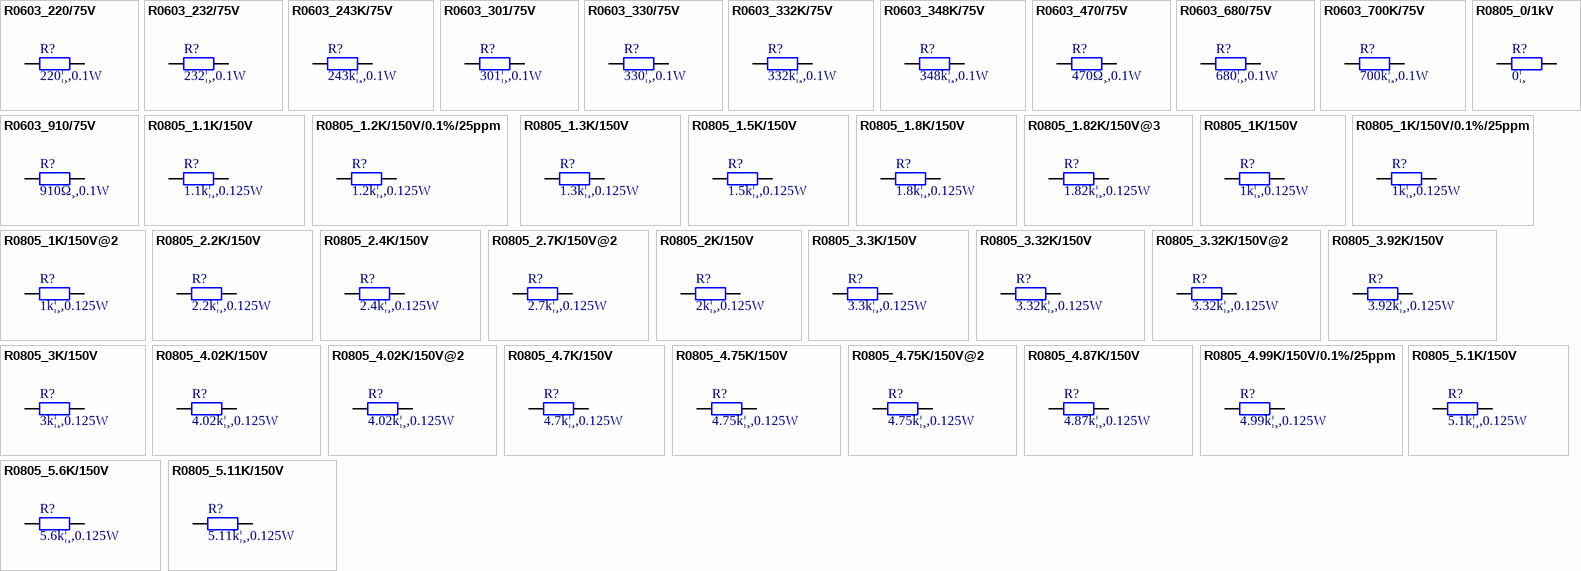
[diagram p31: symbols R0603_220/75V to R0805_5.11K/150V]

## R0603_220/75V
designator R?, comment 220¦¸,0.1W
ÌùÆ¬µç×è; Manufacturer: KOA; pro-environment: RoHS; Quality: -55~155¡æ; SN: 03.4.38.11.16022101S; other: 220¦¸,0.1W,1%,75V; OPN: RK73H1JTTD2200F; PadsNum: 2; Category: µç×è; Part: RK73H1JTTD2200F; Value: 220¦¸,0.1W; Price: ?; OPN_JLC: 0603WAF2200T5E; SN_JLC: C22962; Price_JLC: 0
footprint R0603 (ÌùÆ¬µç×è£¬¹¦ÂÊ1/10W)
pins: 1, 2

## R0603_232/75V
designator R?, comment 232¦¸,0.1W
ÌùÆ¬µç×è; Manufacturer: KOA; pro-environment: RoHS; Quality: -55~155¡æ; SN: 03.4.38.27.16232001S; other: 232k¦¸,0.1W,1%,75V; OPN: RN73H1JTTD2320B25; PadsNum: 2; Category: µç×è; Part: RN73H1JTTD2320B25; Value: 232¦¸,0.1W; QTY: 5000; Price: 0.7605; OPN_JLC: OPN_JLC; SN_JLC: SN_JLC; Price_JLC: 0
footprint R0603 (ÌùÆ¬µç×è£¬¹¦ÂÊ1/10W)
pins: 1, 2

## R0603_243K/75V
designator R?, comment 243k¦¸,0.1W
ÌùÆ¬µç×è; Manufacturer: KOA; pro-environment: RoHS; Quality: -55~155¡æ; other: 243k¦¸,0.1W,1%,75V; OPN: RK73H1JTTD2433F; PadsNum: 2; SN: SN; Category: µç×è; Part: RK73H1JTTD2433F; Value: 243k¦¸,0.1W; QTY: 5000; Price: 0.02457; OPN_JLC: OPN_JLC; SN_JLC: SN_JLC; Price_JLC: 0
footprint R0603 (ÌùÆ¬µç×è£¬¹¦ÂÊ1/10W)
pins: 1, 2

## R0603_301/75V
designator R?, comment 301¦¸,0.1W
ÌùÆ¬µç×è; Manufacturer: Yageo; pro-environment: RoHS; Quality: -55~155¡æ; other: 301¦¸,0.1W,1%,75V; OPN: RC0603FR-07301RL; PadsNum: 2; SN: SN; Category: µç×è; Part: RC0603FR-07301RL; Value: 301¦¸,0.1W; QTY: 5000; Price: 0.005068; OPN_JLC: RC0603FR-07301RL; SN_JLC: C23138; Price_JLC: 0.005068
footprint R0603 (ÌùÆ¬µç×è£¬¹¦ÂÊ1/10W)
pins: 1, 2

## R0603_330/75V
designator R?, comment 330¦¸,0.1W
ÌùÆ¬µç×è; Manufacturer: KOA; pro-environment: RoHS; Quality: -55~155¡æ; other: 330¦¸,0.1W,1%,75V; OPN: RK73H1JTTD3300F; PadsNum: 2; SN: SN; Category: µç×è; Part: RK73H1JTTD3300F; Value: 330¦¸,0.1W; QTY: 5000; Price: 0.0234; OPN_JLC: 0603WAF3300T5E; SN_JLC: C23138; Price_JLC: 0
footprint R0603 (ÌùÆ¬µç×è£¬¹¦ÂÊ1/10W)
pins: 1, 2

## R0603_332K/75V
designator R?, comment 332k¦¸,0.1W
ÌùÆ¬µç×è; Manufacturer: Yageo; pro-environment: RoHS; Quality: -55~155¡æ; SN: 03.4.38.11.16033401S; other: 332k¦¸,0.1W,1%,75V; OPN: RC0603FR-07332KL; PadsNum: 2; Category: µç×è; Part: RC0603FR-07332KL; Value: 332k¦¸,0.1W; QTY: 5000; Price: ?; OPN_JLC: OPN_JLC; SN_JLC: SN_JLC; Price_JLC: 0
footprint R0603 (ÌùÆ¬µç×è£¬¹¦ÂÊ1/10W)
pins: 1, 2

## R0603_348K/75V
designator R?, comment 348k¦¸,0.1W
ÌùÆ¬µç×è; Manufacturer: Yageo; pro-environment: RoHS; Quality: -55~155¡æ; other: 348k¦¸,0.1W,1%,75V; OPN: AC0603FR-07348KL; PadsNum: 2; SN: SN; Category: µç×è; Part: AC0603FR-07348KL; Value: 348k¦¸,0.1W; QTY: 5000; Price: ?; OPN_JLC: AC0603FR-07348KL; SN_JLC: C227828; Price_JLC: 0.017857
footprint R0603 (ÌùÆ¬µç×è£¬¹¦ÂÊ1/10W)
pins: 1, 2

## R0603_470/75V
designator R?, comment 470Ω¸,0.1W
Manufacturer: KOA; pro-environment: RoHS; Quality: -55~155¡æ; other: 470Ω¸¸,0.1W,1%,75V; PadsNum: 2; Value: 470Ω¸,0.1W; Price: ?; Price_JLC: 0
footprint R0603 (ÌùÆ¬µç×è£¬¹¦ÂÊ1/10W)
pins: 1, 2

## R0603_680/75V
designator R?, comment 680¦¸,0.1W
ÌùÆ¬µç×è; Manufacturer: KOA; pro-environment: RoHS; Quality: -55~155¡æ; SN: 03.4.38.11.16068101S; other: 680¦¸,0.1W,1%,75V; OPN: RK73H1JTTD6800F; PadsNum: 2; Category: µç×è; Part: RK73H1JTTD6800F; Value: 680¦¸,0.1W; QTY: 5000; Price: 0.0234; OPN_JLC: 0603WAF6800T5E; SN_JLC: C23228; Price_JLC: 0
footprint R0603 (ÌùÆ¬µç×è£¬¹¦ÂÊ1/10W)
pins: 1, 2

## R0603_700K/75V
designator R?, comment 700k¦¸,0.1W
ÌùÆ¬µç×è; Manufacturer: Yageo; pro-environment: RoHS; Quality: -55~155¡æ; other: 700k¦¸,0.1W,1%,75V; OPN: RC0603FR-07698KL; PadsNum: 2; SN: SN; Category: µç×è; Part: RC0603FR-07698KL; Value: 700k¦¸,0.1W; QTY: 5000; Price: 0.004254; OPN_JLC: 0603WAF6983T5E; SN_JLC: C23233; Price_JLC: 0.004503
footprint R0603 (ÌùÆ¬µç×è£¬¹¦ÂÊ1/10W)
pins: 1, 2

## R0603_910/75V
designator R?, comment 910Ω¸,0.1W
Manufacturer: KOA; pro-environment: RoHS; Quality: -55~155¡æ; SN: 1.16022101S; other: 910Ω¸¸,0.1W,1%,75V; PadsNum: 2; Category: µç×è; Value: 910Ω¸,0.1W; Price: ?; SN_JLC: C22962; Price_JLC: 0
footprint R0603 (ÌùÆ¬µç×è£¬¹¦ÂÊ1/10W)
pins: 1, 2

## R0805_0/1kV
designator R?, comment 0¦¸
ÌùÆ¬µç×è; Manufacturer: KOA; pro-environment: RoHS; Quality: -55~155¡æ; OPN: RK73Z2ATTD; PadsNum: 2; SN: SN; other: 0¦¸; Category: µç×è; Part: RK73Z2ATTD; Value: 0¦¸; QTY: 5000; Price: 0.03393; OPN_JLC: 0805F0000T5E; SN_JLC: C17477; Price_JLC: 0
footprint R0805 (ÌùÆ¬µç×è£¬¹¦ÂÊ1/8W)
pins: 1, 2

## R0805_1.1K/150V
designator R?, comment 1.1k¦¸,0.125W
ÌùÆ¬µç×è; Manufacturer: KOA; pro-environment: RoHS; Quality: -55~155¡æ; SN: 03.4.38.11.17011201S; other: 1.1k¦¸,0.125W,1%,150V; OPN: RK73H2ATTD1101F; PadsNum: 2; Category: µç×è; Part: RK73H2ATTD1101F; Value: 1.1k¦¸,0.125W; QTY: 5000; Price: 0.03393; OPN_JLC: OPN_JLC; SN_JLC: SN_JLC; Price_JLC: 0
footprint R0805 (ÌùÆ¬µç×è£¬¹¦ÂÊ1/8W)
pins: 1, 2

## R0805_1.2K/150V/0.1%/25ppm
designator R?, comment 1.2k¦¸,0.125W
ÌùÆ¬µç×è; 0.1%; 25ppm; Manufacturer: Viking; Part: ARG05FTC1821N; pro-environment: RoHS; Quality: -55~155¡æ; other: 1.2k¦¸,0.125W,0.1%,150V; OPN: AR05BTCW1201; PadsNum: 2; SN: SN; Category: µç×è; Value: 1.2k¦¸,0.125W; QTY: 5000; Price: 0.225061; OPN_JLC: AR05BTCW1201; SN_JLC: C316214; Price_JLC: 0.225061
footprint R0805 (ÌùÆ¬µç×è£¬¹¦ÂÊ1/8W)
pins: 1, 2

## R0805_1.3K/150V
designator R?, comment 1.3k¦¸,0.125W
ÌùÆ¬µç×è; Manufacturer: KOA; pro-environment: RoHS; Quality: -55~155¡æ; other: 1.3k¦¸,0.125W,1%,150V; OPN: RK73H2ATTD1301F; PadsNum: 2; SN: SN; Category: µç×è; Part: RK73H2ATTD1301F; Value: 1.3k¦¸,0.125W; QTY: 5000; Price: 0.04212; OPN_JLC: OPN_JLC; SN_JLC: SN_JLC; Price_JLC: 0
footprint R0805 (ÌùÆ¬µç×è£¬¹¦ÂÊ1/8W)
pins: 1, 2

## R0805_1.5K/150V
designator R?, comment 1.5k¦¸,0.125W
ÌùÆ¬µç×è; Manufacturer: KOA; pro-environment: RoHS; Quality: -55~155¡æ; other: 1.5k¦¸,0.125W,1%,150V; OPN: RK73H2ATTD1501F; PadsNum: 2; SN: SN; Category: µç×è; Part: RK73H2ATTD1501F; Value: 1.5k¦¸,0.125W; QTY: 4000; Price: 0.03393; OPN_JLC: 0805F1501T5E; SN_JLC: C4310; Price_JLC: 0
footprint R0805 (ÌùÆ¬µç×è£¬¹¦ÂÊ1/8W)
pins: 1, 2

## R0805_1.8K/150V
designator R?, comment 1.8k¦¸,0.125W
ÌùÆ¬µç×è; Manufacturer: KOA; pro-environment: RoHS; Quality: -55~155¡æ; other: 1.8k¦¸,0.125W,1%,150V; OPN: RK73H2BTTD1801F; PadsNum: 2; SN: SN; Category: µç×è; Part: RK73H2BTTD1801F; Value: 1.8k¦¸,0.125W; QTY: 4000; Price: 0.03393; OPN_JLC: 0805W8F1801T5E; SN_JLC: C17398; Price_JLC: 0
footprint R0805 (ÌùÆ¬µç×è£¬¹¦ÂÊ1/8W)
pins: 1, 2

## R0805_1.82K/150V@3
designator R?, comment 1.82k¦¸,0.125W
ÌùÆ¬µç×è; Manufacturer: Viking; pro-environment: RoHS; Quality: -55~155¡æ; other: 1.82k¦¸,0.125W,1%,150V; OPN: ARG05FTC1821N; PadsNum: 2; SN: SN; Category: µç×è; Part: ARG05FTC1821N; Value: 1.82k¦¸,0.125W; QTY: 5000; Price: 0.035102; OPN_JLC: ARG05FTC1821N; SN_JLC: C218404; Price_JLC: 0.035102
footprint R0805 (ÌùÆ¬µç×è£¬¹¦ÂÊ1/8W)
pins: 1, 2

## R0805_1K/150V
designator R?, comment 1k¦¸,0.125W
ÌùÆ¬µç×è; Manufacturer: KOA; pro-environment: RoHS; Quality: -55~155¡æ; SN: 03.4.38.11.17010204s; other: 1k¦¸,0.125W,1%,150V; OPN: RK73H2ATTE1001F; PadsNum: 2; Category: µç×è; Part: RK73H2ATTE1001F; Value: 1k¦¸,0.125W; QTY: 4000; Price: 0.04095; OPN_JLC: 0805W8F1001T5E; SN_JLC: C17513; Price_JLC: 0
footprint R0805 (ÌùÆ¬µç×è£¬¹¦ÂÊ1/8W)
pins: 1, 2

## R0805_1K/150V/0.1%/25ppm
designator R?, comment 1k¦¸,0.125W
¾«ÃÜµç×è; 0.1%; 25ppm; Manufacturer: Viking; pro-environment: RoHS; Quality: -55~155¡æ; other: 1k¦¸,0.125W,0.1%,150V; OPN: ARG05BTC1001; PadsNum: 2; SN: SN; Category: µç×è; Part: ARG05BTC1001; Value: 1k¦¸,0.125W; QTY: 5000; Price: 0.125397; OPN_JLC: ARG05BTC1001; SN_JLC: C309081; Price_JLC: 0.125397
footprint R0805 (ÌùÆ¬µç×è£¬¹¦ÂÊ1/8W)
pins: 1, 2

## R0805_1K/150V@2
designator R?, comment 1k¦¸,0.125W
ÌùÆ¬µç×è; Manufacturer: Panasonic; pro-environment: RoHS; Quality: -55~155¡æ; other: 1k¦¸,0.125W,1%,150V; OPN: ERJ-6ENF1001V; PadsNum: 2; SN: SN; Category: µç×è; Part: ERJ-6ENF1001V; Value: 1k¦¸,0.125W; Price: ?; OPN_JLC: 0805W8F1001T5E; SN_JLC: C17513; Price_JLC: 0
footprint R0805 (ÌùÆ¬µç×è£¬¹¦ÂÊ1/8W)
pins: 1, 2

## R0805_2.2K/150V
designator R?, comment 2.2k¦¸,0.125W
ÌùÆ¬µç×è; Manufacturer: KOA; pro-environment: RoHS; Quality: -55~155¡æ; SN: 03.4.38.11.17022201S; other: 2.2k¦¸,0.125W,1%,150V; OPN: RK73H2ATTD2201F; PadsNum: 2; Category: µç×è; Part: RK73H2ATTD2201F; Value: 2.2k¦¸,0.125W; QTY: 5000; Price: 0.03393; OPN_JLC: 0805W8F2201T5E; SN_JLC: C17520; Price_JLC: 0
footprint R0805 (ÌùÆ¬µç×è£¬¹¦ÂÊ1/8W)
pins: 1, 2

## R0805_2.4K/150V
designator R?, comment 2.4k¦¸,0.125W
ÌùÆ¬µç×è; Manufacturer: Yageo; pro-environment: RoHS; Quality: -55~155¡æ; SN: C114521; other: 2.2k¦¸,0.125W,1%,150V; OPN: RC0805FR-072K4L; PadsNum: 2; Category: µç×è; Part: RC0805FR-072K4L; Value: 2.4k¦¸,0.125W; QTY: 5000; Price: 0.017603; OPN_JLC: 0805W8F2401T5E; SN_JLC: C17526; Price_JLC: 0.014377
footprint R0805 (ÌùÆ¬µç×è£¬¹¦ÂÊ1/8W)
pins: 1, 2

## R0805_2.7K/150V@2
designator R?, comment 2.7k¦¸,0.125W
ÌùÆ¬µç×è; Manufacturer: Panasonic; pro-environment: RoHS; Quality: -55~155¡æ; SN: 03.4.38.11.17027202S; other: 2.7k¦¸,0.125W,5%,150V; OPN: ERJ6GEYJ272V; PadsNum: 2; Category: µç×è; Part: ERJ6GEYJ272V; Value: 2.7k¦¸,0.125W; QTY: 5000; Price: ?; OPN_JLC: 0805W8F2701T5E; SN_JLC: C17530; Price_JLC: 0
footprint R0805 (ÌùÆ¬µç×è£¬¹¦ÂÊ1/8W)
pins: 1, 2

## R0805_2K/150V
designator R?, comment 2k¦¸,0.125W
ÌùÆ¬µç×è; Manufacturer: KOA; pro-environment: RoHS; Quality: -55~155¡æ; other: 2k¦¸,0.125W,1%,150V; OPN: RK73H2ATTD2001F; PadsNum: 2; SN: SN; Category: µç×è; Part: RK73H2ATTD2001F; Value: 2k¦¸,0.125W; QTY: 5000; Price: 0.03042; OPN_JLC: 0805W8F2001T5E; SN_JLC: C17604; Price_JLC: 0
footprint R0805 (ÌùÆ¬µç×è£¬¹¦ÂÊ1/8W)
pins: 1, 2

## R0805_3.3K/150V
designator R?, comment 3.3k¦¸,0.125W
ÌùÆ¬µç×è; Manufacturer: KOA; pro-environment: RoHS; Quality: -55~155¡æ; SN: 03.4.38.11.17033202S; other: 3.3k¦¸,0.125W,1%,150V; OPN: RK73H2ATTD3301F; PadsNum: 2; Category: µç×è; Part: RK73H2ATTD3301F; Value: 3.3k¦¸,0.125W; Price: ?; OPN_JLC: 0805W8F3301T5E; SN_JLC: C26010; Price_JLC: 0
footprint R0805 (ÌùÆ¬µç×è£¬¹¦ÂÊ1/8W)
pins: 1, 2

## R0805_3.32K/150V
designator R?, comment 3.32k¦¸,0.125W
ÌùÆ¬µç×è; Manufacturer: KOA; pro-environment: RoHS; Quality: -55~155¡æ; other: 3.32k¦¸,0.125W,1%,150V; OPN: RK73H2ATTE3321F; PadsNum: 2; SN: SN; Category: µç×è; Part: RK73H2ATTE3321F; Value: 3.32k¦¸,0.125W; Price: ?; OPN_JLC: OPN_JLC; SN_JLC: SN_JLC; Price_JLC: 0
footprint R0805 (ÌùÆ¬µç×è£¬¹¦ÂÊ1/8W)
pins: 1, 2

## R0805_3.32K/150V@2
designator R?, comment 3.32k¦¸,0.125W
ÌùÆ¬µç×è; Manufacturer: Panasonic; pro-environment: RoHS; Quality: -55~155¡æ; other: 3.32k¦¸,0.125W,1%,150V; OPN: ERJ-6ENF3321V; PadsNum: 2; SN: SN; Category: µç×è; Part: ERJ-6ENF3321V; Value: 3.32k¦¸,0.125W; QTY: 5000; Price: 0.03393; OPN_JLC: OPN_JLC; SN_JLC: SN_JLC; Price_JLC: 0
footprint R0805 (ÌùÆ¬µç×è£¬¹¦ÂÊ1/8W)
pins: 1, 2

## R0805_3.92K/150V
designator R?, comment 3.92k¦¸,0.125W
ÌùÆ¬µç×è; Manufacturer: KOA; pro-environment: RoHS; Quality: -55~155¡æ; SN: 03.4.38.11.17039304S; other: 3.92k¦¸,0.125W,1%,150V; OPN: RK73H2ATTD3921F; PadsNum: 2; Category: µç×è; Part: RK73H2ATTD3921F; Value: 3.92k¦¸,0.125W; QTY: 5000; Price: 0.03042; OPN_JLC: OPN_JLC; SN_JLC: SN_JLC; Price_JLC: 0
footprint R0805 (ÌùÆ¬µç×è£¬¹¦ÂÊ1/8W)
pins: 1, 2

## R0805_3K/150V
designator R?, comment 3k¦¸,0.125W
ÌùÆ¬µç×è; Manufacturer: KOA; pro-environment: RoHS; Quality: -55~155¡æ; SN: 03.4.38.11.17030202S; other: 3k¦¸,0.125W,1%,150V; OPN: RK73H2ATTD3001F; PadsNum: 2; Category: µç×è; Part: RK73H2ATTD3001F; Value: 3k¦¸,0.125W; QTY: 5000; Price: 0.03042; OPN_JLC: 0805W8F3001T5E; SN_JLC: C17661; Price_JLC: 0
footprint R0805 (ÌùÆ¬µç×è£¬¹¦ÂÊ1/8W)
pins: 1, 2

## R0805_4.02K/150V
designator R?, comment 4.02k¦¸,0.125W
ÌùÆ¬µç×è; Manufacturer: KOA; pro-environment: RoHS; Quality: -55~155¡æ; other: 4.02k¦¸,0.125W,1%,150V; OPN: RK73H2ATTD4021F; PadsNum: 2; SN: SN; Category: µç×è; Part: RK73H2ATTD4021F; Value: 4.02k¦¸,0.125W; Price: ?; OPN_JLC: OPN_JLC; SN_JLC: SN_JLC; Price_JLC: 0
footprint R0805 (ÌùÆ¬µç×è£¬¹¦ÂÊ1/8W)
pins: 1, 2

## R0805_4.02K/150V@2
designator R?, comment 4.02k¦¸,0.125W
ÌùÆ¬µç×è; Manufacturer: Panasonic; pro-environment: RoHS; Quality: -55~155¡æ; other: 4.02k¦¸,0.125W,1%,150V; OPN: ERJ-6ENF4021V; PadsNum: 2; SN: SN; Category: µç×è; Part: ERJ-6ENF4021V; Value: 4.02k¦¸,0.125W; Price: ?; OPN_JLC: OPN_JLC; SN_JLC: SN_JLC; Price_JLC: 0
footprint R0805 (ÌùÆ¬µç×è£¬¹¦ÂÊ1/8W)
pins: 1, 2

## R0805_4.7K/150V
designator R?, comment 4.7k¦¸,0.125W
ÌùÆ¬µç×è; Manufacturer: KOA; pro-environment: RoHS; Quality: -55~155¡æ; other: 4.7k¦¸,0.125W,1%,150V; OPN: RK73H2ATTD4701F; PadsNum: 2; SN: SN; Category: µç×è; Part: RK73H2ATTD4701F; Value: 4.7k¦¸,0.125W; Price: ?; OPN_JLC: 0805W8F4701T5E; SN_JLC: C17673; Price_JLC: 0
footprint R0805 (ÌùÆ¬µç×è£¬¹¦ÂÊ1/8W)
pins: 1, 2

## R0805_4.75K/150V
designator R?, comment 4.75k¦¸,0.125W
ÌùÆ¬µç×è; Manufacturer: KOA; pro-environment: RoHS; Quality: -55~155¡æ; other: 4.75k¦¸,0.125W,1%,150V; OPN: RK73H2ATTD4751F; PadsNum: 2; SN: SN; Category: µç×è; Part: RK73H2ATTD4751F; Value: 4.75k¦¸,0.125W; Price: ?; OPN_JLC: OPN_JLC; SN_JLC: SN_JLC; Price_JLC: 0
footprint R0805 (ÌùÆ¬µç×è£¬¹¦ÂÊ1/8W)
pins: 1, 2

## R0805_4.75K/150V@2
designator R?, comment 4.75k¦¸,0.125W
ÌùÆ¬µç×è; Manufacturer: Panasonic; pro-environment: RoHS; Quality: -55~155¡æ; other: 4.75k¦¸,0.125W,1%,150V; OPN: ERJ-6ENF4751V; PadsNum: 2; SN: SN; Category: µç×è; Part: ERJ-6ENF4751V; Value: 4.75k¦¸,0.125W; Price: ?; OPN_JLC: OPN_JLC; SN_JLC: SN_JLC; Price_JLC: 0
footprint R0805 (ÌùÆ¬µç×è£¬¹¦ÂÊ1/8W)
pins: 1, 2

## R0805_4.87K/150V
designator R?, comment 4.87k¦¸,0.125W
ÌùÆ¬µç×è; Manufacturer: KOA; pro-environment: RoHS; Quality: -55~155¡æ; other: 4.87k¦¸,0.125W,1%,150V; OPN: RK73H2ATTD4871F; PadsNum: 2; SN: SN; Category: µç×è; Part: RK73H2ATTD4871F; Value: 4.87k¦¸,0.125W; QTY: 5000; Price: 0.03393; OPN_JLC: OPN_JLC; SN_JLC: SN_JLC; Price_JLC: 0
footprint R0805 (ÌùÆ¬µç×è£¬¹¦ÂÊ1/8W)
pins: 1, 2

## R0805_4.99K/150V/0.1%/25ppm
designator R?, comment 4.99k¦¸,0.125W
¾«ÃÜµç×è; 0.1%; 25ppm; Manufacturer: Viking; pro-environment: RoHS; Quality: -55~155¡æ; other: 4.99k¦¸,0.125W,0.1%,150V; OPN: ARG05BTC4991; PadsNum: 2; SN: SN; Category: µç×è; Part: ARG05BTC4991; Value: 4.99k¦¸,0.125W; QTY: 5000; Price: 0.142826; OPN_JLC: ARG05BTC4991; SN_JLC: C515733; Price_JLC: 0.142826
footprint R0805 (ÌùÆ¬µç×è£¬¹¦ÂÊ1/8W)
pins: 1, 2

## R0805_5.1K/150V
designator R?, comment 5.1k¦¸,0.125W
ÌùÆ¬µç×è; Manufacturer: KOA; pro-environment: RoHS; Quality: -55~155¡æ; SN: 03.4.38.11.17051201S; other: 5.1k¦¸,0.125W,1%,150V; OPN: RK73H2ATTD5101F; PadsNum: 2; Category: µç×è; Part: RK73H2ATTD5101F; Value: 5.1k¦¸,0.125W; QTY: 5000; Price: 0.03393; OPN_JLC: 0805F5101T5E; SN_JLC: C27834; Price_JLC: 0
footprint R0805 (ÌùÆ¬µç×è£¬¹¦ÂÊ1/8W)
pins: 1, 2

## R0805_5.6K/150V
designator R?, comment 5.6k¦¸,0.125W
ÌùÆ¬µç×è; Manufacturer: KOA; pro-environment: RoHS; Quality: -55~155¡æ; other: 5.6k¦¸,0.125W,1%,150V; OPN: RK73H2ATTD5601F; PadsNum: 2; SN: SN; Category: µç×è; Part: RK73H2ATTD5601F; Value: 5.6k¦¸,0.125W; QTY: 5000; Price: ?; OPN_JLC: 0805W8F5601T5E; SN_JLC: C4382; Price_JLC: 0
footprint R0805 (ÌùÆ¬µç×è£¬¹¦ÂÊ1/8W)
pins: 1, 2

## R0805_5.11K/150V
designator R?, comment 5.11k¦¸,0.125W
ÌùÆ¬µç×è; Manufacturer: KOA; pro-environment: RoHS; Quality: -55~155¡æ; other: 5.11k¦¸,0.125W,1%,150V; OPN: RK73H2ATTD5111F; PadsNum: 2; SN: SN; Category: µç×è; Part: RK73H2ATTD5111F; Value: 5.11k¦¸,0.125W; Price: ?; OPN_JLC: OPN_JLC; SN_JLC: SN_JLC; Price_JLC: 0
footprint R0805 (ÌùÆ¬µç×è£¬¹¦ÂÊ1/8W)
pins: 1, 2

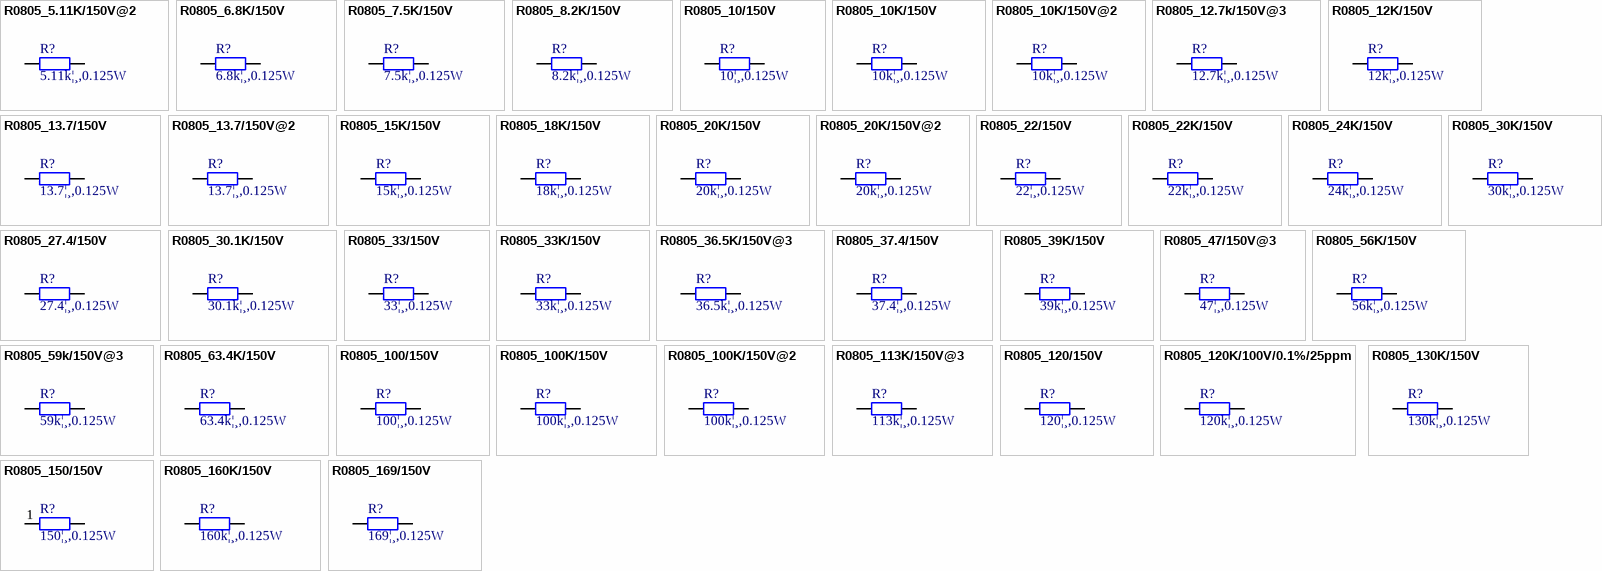
[diagram p32: symbols R0805_5.11K/150V@2 to R0805_169/150V]
